# Altium footprint library Lib_001_rus.PcbLib: 38 footprints (part 2 of 3)
Each footprint in its own frame and in the unit in brackets; x right, y up, seen from the top. Pads: shape width x height; smd on the part's side, far side on the other; paste and mask are expansions set on the pad; w line width, h text height; cw(c..) or ccw(c..) is an arc to the next point about the centre after c.
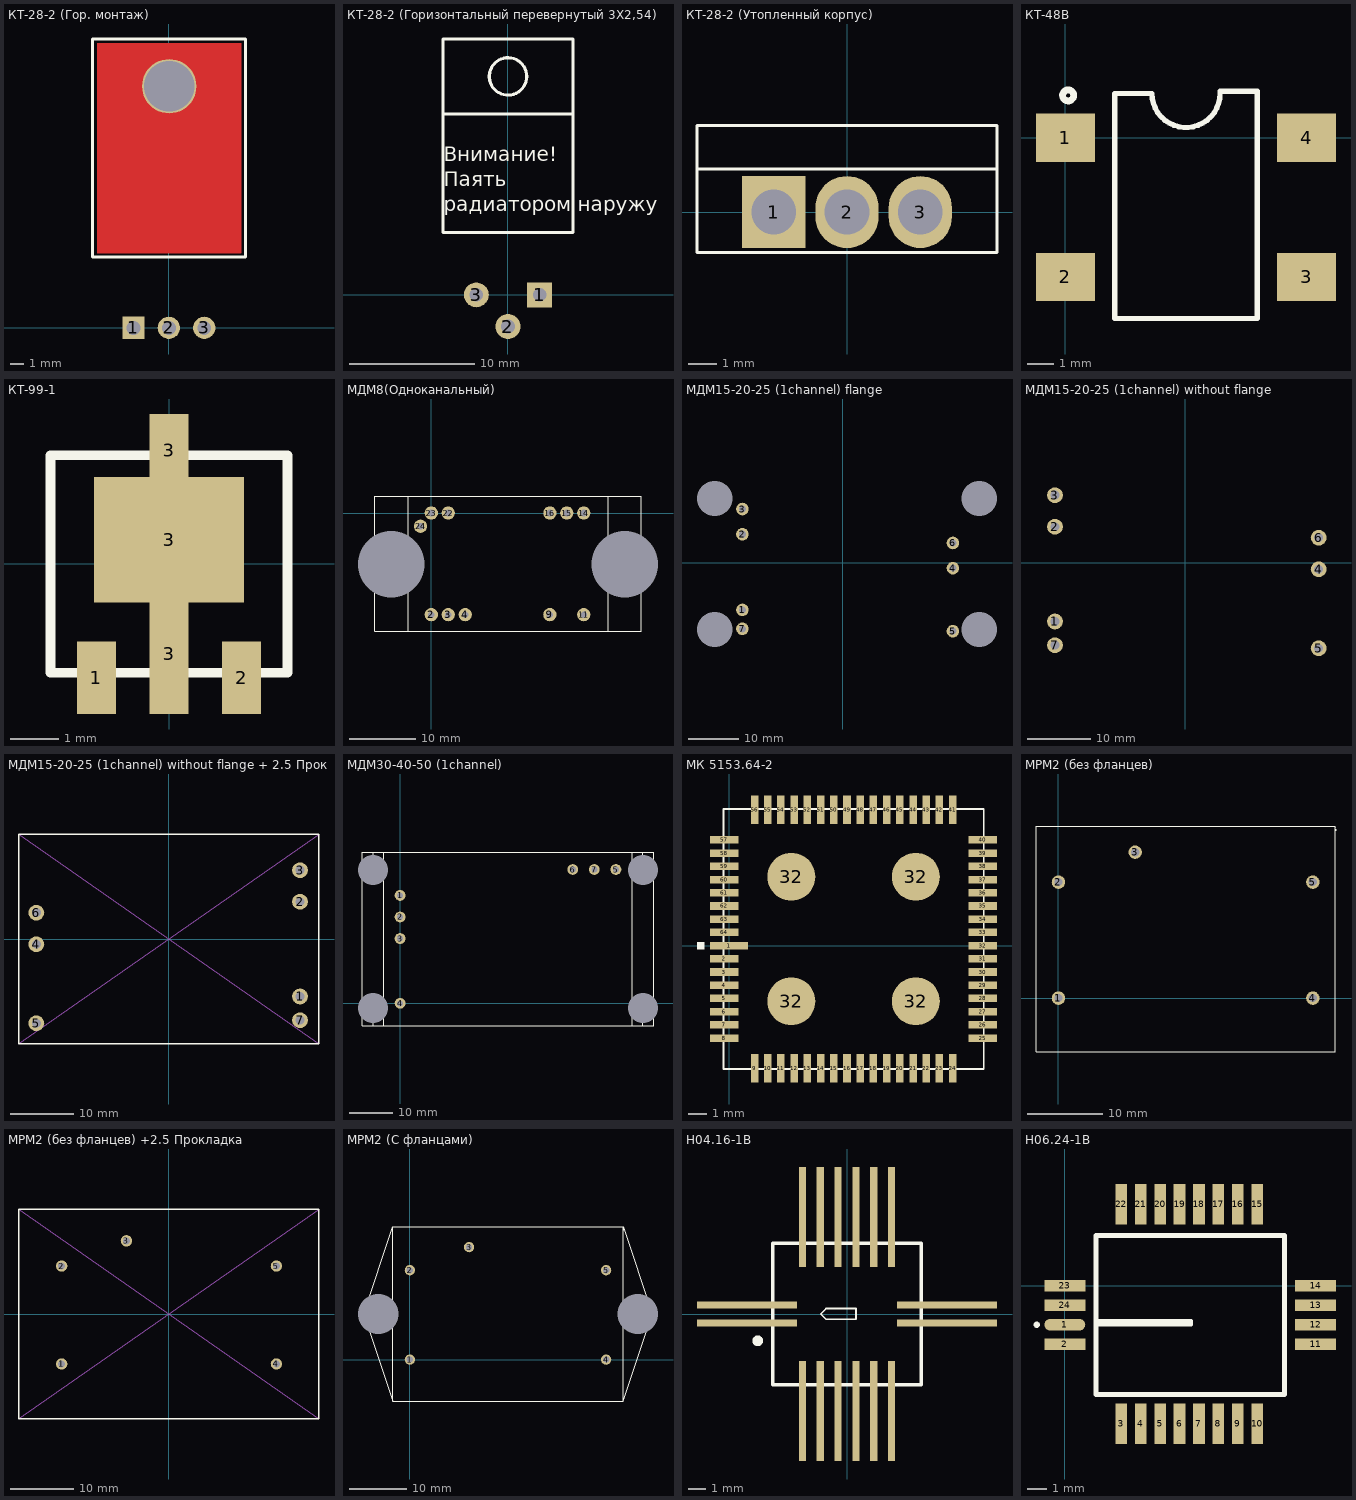
[diagram p1: the footprints below, top view; thin cyan lines are the x and y axes]

## КТ-28-2 (Гор. монтаж) [mm]
height 4.7
pads (4):
  rect 1.6x1.6 hole 1: 1(-2.54,0)
  round 1.6 hole 1: 2(0,0) 3(2.54,0)
  round 3.9 hole 3.6 unplated: ""(0.025,17.35)
Top Layer:
  rectangle: -5.175,5.35 5.225,20.44
Top Overlay:
  lines w0.203: -5.49,5.085 5.509,5.085 5.509,20.742 -5.49,20.742 -5.49,5.085
3D body "TO-220AC_horiz.STEP": height 4.4, standoff -3, extent -5.2,-0.25 5.2,20.5

## КТ-28-2 (Горизонтальный перевернутый 3Х2,54) [mm]
height 4.7
pads (3):
  rect 2x2 hole 1.1: 1(2.54,0)
  round 2 hole 1.1: 2(0,-2.54) 3(-2.54,0)
Top Overlay:
  circle w0.254: c0,17.5 r1.5
  lines w0.254: -5.2,14.5 5.2,14.5 ; -5.2,5 -5.2,20.5 5.2,20.5 5.2,5 -5.2,5
  text "Внимание! / Паять  / радиатором наружу" at -5.14,6.314 h2
3D body "КТ-28-2_горизонтальный перевёрнутый треугольник.stp": height 4.7, standoff -3.9, extent -5.25,-2.79 5.25,20.5

## КТ-28-2 (Утопленный корпус) [mm] "Низкая посадка"
height 4.7
pads (3):
  rect 2.2x2.5 hole 1.55: 1(-2.54,0)
  oval 2.2x2.5 hole 1.55: 2(0,0) 3(2.54,0)
Top Overlay:
  lines w0.1: -5.2,1.5 5.2,1.5 ; -5.2,-1.4 -5.2,3 5.2,3 5.2,-1.4 -5.2,-1.4
3D body "TO-220AC_vert_54.stp": height 15, standoff -4, extent -5.204,-1.403 5.196,2.997

## КТ-48В [mm] "Bridge Rectifiers"
pads (4):
  rect 2.2x1.8 smd: 1(0,0) 2(0,-5.2) 3(9,-5.2) 4(9,0)
Top Overlay:
  lines w0.2: 5.77,1.65 cw(c4.5,1.65) 3.23,1.65 1.835,1.65 1.835,-6.75 7.165,-6.75 7.165,1.73 5.77,1.73
  lines w0.254: 0.306,1.603 ccw(c0.1,1.58) 0.307,1.57
3D body "User Library-DFS.STEP": height 2.61, standoff 0.02, extent -0.62,-6.64 9.68,1.56

## КТ-99-1 [mm] "4601.3-1"
pads (5):
  rect 0.8x1.5 smd: 1(-1.5,-2.35) 2(1.5,-2.35) 3(0,2.35)
  rect 0.8x2.5 smd: 3(0,-1.85)
  rect 3.1x2.6 smd: 3(0,0.5)
Top Overlay:
  lines w0.2: -2.45,-2.25 2.45,-2.25 2.45,2.25 -2.45,2.25 -2.45,-2.25
3D body "KT-99-1.step": height 1.74, standoff 0, extent -2.3,-2.6 2.3,2.6

## МДМ8(Одноканальный) [mm] "Аедон"
pads (13):
  round 2 hole 1: 2(0,-15.24) 3(2.54,-15.24) 4(5.08,-15.24) 9(17.78,-15.24) 11(22.86,-15.24) 14(22.86,0) 15(20.32,0) 16(17.78,0) 22(2.54,0) 23(0,0) 24(-1.62,-1.99)
  round 5 hole 10 unplated: ""(-6,-7.7) ""(29,-7.7)
Top Overlay:
  lines w0.15: -3.5,-17.8 -3.5,2.5 ; 0,0 0.2,0 ; 26.5,-17.727 26.5,2.5 ; -8.5,-17.73 -8.5,2.5 31.5,2.5 31.5,-17.73 -8.5,-17.73
3D body "МДМ8-1УВ.STP": height 10, standoff -6.15, extent -8.58,-17.83 31.42,2.37

## МДМ15-20-25 (1channel) flange [mm]
pads (11):
  round 2.5 hole 1.4: 1(-19.9,-9.3) 2(-19.9,5.7) 3(-19.9,10.7) 4(21.85,-1.03) 5(21.85,-13.53) 6(21.85,3.97) 7(-19.9,-13.05)
  round 2.1 hole 7 unplated: ""(-25.4,-13.2) ""(-25.4,12.8) ""(27.1,-13.2) ""(27.1,12.8)
Bottom Overlay:
  lines w0.2: -25.4,-13.2 -25.4,-16.8 ; -25.4,12.8 -25.4,16.4 ; -22.9,-16.8 -22.9,10.7 -22.9,16.4 ; 24.6,-16.8 24.6,16.4 ; 27.1,-13.2 27.1,-16.8 ; 27.1,12.8 27.1,16.4 ; -25.4,-16.8 27.1,-16.8 ; -25.4,-16.8 -27.9,-16.8 -27.9,16.4 -25.4,16.4 ; -25.4,16.4 27.1,16.4 ; 27.1,-16.8 29.6,-16.8 29.6,16.4 27.1,16.4
3D body "МДМ7,5(15,20)-1УП.stp": height 5.55, standoff -10.6, extent -27.9,-16.8 29.6,16.4

## МДМ15-20-25 (1channel) without flange [mm]
pads (7):
  round 2.5 hole 1.4: 1(-20.6,-9.3) 2(-20.6,5.7) 3(-20.6,10.7) 4(21.15,-1.03) 5(21.15,-13.53) 6(21.15,3.97) 7(-20.6,-13.05)
Bottom Overlay:
  lines w0.2: -23.6,-16.8 -23.6,16.4 23.9,16.4 23.9,-16.8 -23.6,-16.8
3D body "МДМ20-1В.stp": height 5.55, standoff -10.65, extent -23.6,-16.8 24.1,16.4

## МДМ15-20-25 (1channel) without flange + 2.5 Прокладка [mm]
pads (7):
  round 2.5 hole 1.4: 1(20.75,-9.1) 2(20.75,5.9) 3(20.75,10.9) 4(-21,-0.83) 5(-21,-13.35) 6(-21,4.17) 7(20.75,-12.85)
Top Overlay:
  lines w0.2: -23.75,-16.6 23.75,-16.6 23.75,16.6 -23.75,16.6 -23.75,-16.6
Mechanical 1:
  lines w0.15: -23.75,-16.6 23.75,16.6 ; -23.75,16.6 23.75,-16.6
3D body "МДМ15-1В09ТП БКЯЮ.436630.001 ТУ 2.5мм.stp": height 12.65, standoff -3.5, extent -23.75,-16.6 23.75,16.6

## МДМ30-40-50 (1channel) [mm]
pads (11):
  round 2.5 hole 1.4: 1(0,25) 2(0,20) 3(0,15) 4(0,0) 5(50,31) 6(40,31) 7(45,31)
  round 2.1 hole 7 unplated: ""(-6.25,-1.1) ""(-6.25,30.9) ""(56.25,-1.1) ""(56.25,30.9)
Top Overlay:
  lines w0.2: -6.25,-1.1 -6.25,-5.2 ; -6.25,30.9 -6.25,35 ; 56.25,-1.1 56.25,-5.2 ; 56.25,30.9 56.25,35 ; -6.25,-5.2 -3.75,-5.2 ; -6.25,-5.2 -8.75,-5.2 -8.75,35 -6.25,35 ; -6.25,35 -3.75,35 ; -3.75,-5.2 53.75,-5.2 ; -3.75,-5.2 -3.75,0 -3.75,35 ; -3.75,35 40,35 53.75,35 ; 53.75,-5.2 56.25,-5.2 ; 53.75,-5.2 53.75,31 53.75,35 ; 53.75,35 56.25,35 ; 56.25,-5.2 58.75,-5.2 58.75,35 56.25,35
3D body "МДМ40-1УВ.stp": height 10.2, standoff -5.95, extent -8.75,-5.2 58.75,35

## МК 5153.64-2 [mm]
pads (68):
  rect 2x0.4 smd: 1(0,0)
  rect 1.5x0.4 smd: 2(-0.25,-0.7) 3(-0.25,-1.4) 4(-0.25,-2.1) 5(-0.25,-2.8) 6(-0.25,-3.5) 7(-0.25,-4.2) 8(-0.25,-4.9) 25(13.45,-4.9) 26(13.45,-4.2) 27(13.45,-3.5) 28(13.45,-2.8) 29(13.45,-2.1) 30(13.45,-1.4) 31(13.45,-0.7) 32(13.45,0) 33(13.45,0.7) 34(13.45,1.4) 35(13.45,2.1) 36(13.45,2.8) 37(13.45,3.5) 38(13.45,4.2) 39(13.45,4.9) 40(13.45,5.6) 57(-0.25,5.6) 58(-0.25,4.9) 59(-0.25,4.2) 60(-0.25,3.5) 61(-0.25,2.8) 62(-0.25,2.1) 63(-0.25,1.4) 64(-0.25,0.7)
  rect 0.4x1.5 smd: 9(1.35,-6.5) 10(2.05,-6.5) 11(2.75,-6.5) 12(3.45,-6.5) 13(4.15,-6.5) 14(4.85,-6.5) 15(5.55,-6.5) 16(6.25,-6.5) 17(6.95,-6.5) 18(7.65,-6.5) 19(8.35,-6.5) 20(9.05,-6.5) 21(9.75,-6.5) 22(10.45,-6.5) 23(11.15,-6.5) 24(11.85,-6.5) 41(11.85,7.2) 42(11.15,7.2) 43(10.45,7.2) 44(9.75,7.2) 45(9.05,7.2) 46(8.35,7.2) 47(7.65,7.2) 48(6.95,7.2) 49(6.25,7.2) 50(5.55,7.2) 51(4.85,7.2) 52(4.15,7.2) 53(3.45,7.2) 54(2.75,7.2) 55(2.05,7.2) 56(1.35,7.2)
  round 2.54 smd: 32(3.3,-2.95) 32(3.3,3.65) 32(9.9,-2.95) 32(9.9,3.65)
Top Overlay:
  rectangle: -1.7,-0.2 -1.3,0.2
  lines w0.1: -0.3,-6.55 13.5,-6.55 13.5,7.25 -0.3,7.25 -0.3,-6.55
3D body "Миландр. STEP-модель для корпуса МК 5153.64-2.STEP": height 1.88, standoff 0, extent -0.3,-6.55 13.5,7.25

## МРМ2 (без фланцев) [mm]
pads (5):
  round 1.8 hole 1.1: 1(0,0) 2(0,15.5) 3(10.25,19.5) 4(34,0) 5(34,15.5)
Top Overlay:
  lines w0.11: 36.996,22.367 36.996,23 37,23 ; 37.063,22.596 37.092,22.596 37.092,22.384
  lines w0.15: -3,-7.2 37,-7.2 37,23 -3,23 -3,-7.2
  lines w0.2: 37.031,22.788 37.037,22.788
3D body "МРМ2-В5ДМ БКЯЮ.468829.005 ТУ.stp": height 5.55, standoff -10.65, extent -3.014,-7.2 36.986,23

## МРМ2 (без фланцев) +2.5 Прокладка [mm]
pads (5):
  round 1.8 hole 1.1: 1(-16.995,-7.909) 2(-16.995,7.591) 3(-6.745,11.591) 4(17.005,-7.909) 5(17.005,7.591)
Top Overlay:
  lines w0.2: -23.75,-16.6 23.75,-16.6 23.75,16.6 -23.75,16.6 -23.75,-16.6
Mechanical 1:
  lines w0.15: -23.75,-16.6 23.75,16.6 ; -23.75,16.6 23.75,-16.6
3D body "МРМ2-В5ДМ БКЯЮ.468829.005 ТУ 2.5мм.stp": height 12.7, standoff -3.5, extent -23.5,-16.5 23.5,16.5

## МРМ2 (С фланцами) [mm]
pads (7):
  round 1.8 hole 1.1: 1(0,0) 2(0,15.5) 3(10.25,19.5) 4(34,0) 5(34,15.5)
  round 1.8 hole 7 unplated: ""(-5.5,7.9) ""(39.5,7.9)
Top Overlay:
  lines w0.11: 36.996,22.367 36.996,23 37,23 ; 37.063,22.596 37.092,22.596 37.092,22.384
  lines w0.15: -3,-7.2 -3,23 ; -3,-7.2 -8,7.9 -3,23 ; -3,-7.2 37,-7.2 ; -3,23 37,23 ; 37,-7.2 42,7.9 37,23 ; 37,-7.2 37,23
  lines w0.2: 37.031,22.788 37.037,22.788
  lines w0.25: -8,7.9 -5.5,7.9 ; 39.5,7.9 42,7.9
3D body "mrm2.stp": height 3.9, standoff -12.3, extent -8,-7.2 42,23

## Н04.16-1В [mm]
pads (16):
  rect 5.6x0.4 smd: 1(-5.6,-0.5) 8(5.6,-0.5) 9(5.6,0.5) 16(-5.6,0.5)
  rect 0.4x5.6 smd: 2(-2.5,-5.44) 3(-1.5,-5.44) 4(-0.5,-5.44) 5(0.5,-5.44) 6(1.5,-5.44) 7(2.5,-5.44) 10(2.5,5.44) 11(1.5,5.44) 12(0.5,5.44) 13(-0.5,5.44) 14(-1.5,5.44) 15(-2.5,5.44)
Top Overlay:
  circle w0.3: c-5,-1.5 r0.15
  lines w0.1: -1.475,0 -1.175,-0.3 0.5,-0.3 0.5,0.3 -1.175,0.3 -1.475,0 ; -1.1,-0.3 -1.1,-0.3
  lines w0.2: -4.15,-3.95 4.15,-3.95 4.15,3.95 -4.15,3.95 -4.15,-3.95
3D body "Н04.16-1В.stp": height 2.92, standoff 0, extent -8,-7.84 8,7.84

## Н06.24-1В [mm]
pads (24):
  oval 2.1x0.6 smd: 1(0,-2)
  rect 2.1x0.6 smd: 2(0,-3) 11(12.9,-3) 12(12.9,-2) 13(12.9,-1) 14(12.9,0) 23(0,0) 24(0,-1)
  rect 0.6x2.1 smd: 3(2.9,-7.1) 4(3.9,-7.1) 5(4.9,-7.1) 6(5.9,-7.1) 7(6.9,-7.1) 8(7.9,-7.1) 9(8.9,-7.1) 10(9.9,-7.1) 15(9.9,4.2) 16(8.9,4.2) 17(7.9,4.2) 18(6.9,4.2) 19(5.9,4.2) 20(4.9,4.2) 21(3.9,4.2) 22(2.9,4.2)
Top Overlay:
  lines w0.2: 1.6,-2 6.5,-2 6.5,-1.8 1.6,-1.8
  lines w0.254: -1.417,-2.013 cw(c-1.45,-2) -1.414,-2 ; 1.6,-5.6 11.3,-5.6 11.3,2.6 1.6,2.6 1.6,-5.6
3D body "User Library-H06_24-1B.STEP": height 3, standoff 0, extent -0.2,-7.3 13,4.3